# Altium footprint library Amplifier.PcbLib: 107 footprints (part 5 of 7) (continued)
## TLA06BBA [mm] "Micro SMD, 6-Leads, Body 1.54x1.03mm, Pitch 0.5mm, NSC Recommended"
height 0.68
pads (6):
  round 0.265 smd paste-0.132 mask+0.05: A1(-0.25,0.5) A2(0.25,0.5) B1(-0.25,0) B2(0.25,0) C1(-0.25,-0.5) C2(0.25,-0.5)
Top Overlay:
  circle w0.1: c-0.62,0.875 r0.05
Top Paste:
  circle w0.05: c-0.325,0.425 r0.025
  circle w0.05: c-0.175,0.575 r0.025
  circle w0.05: c-0.175,0.425 r0.025
  circle w0.05: c-0.325,0.575 r0.025
  circle w0.05: c0.175,0.425 r0.025
  circle w0.05: c0.325,0.575 r0.025
  circle w0.05: c0.325,0.425 r0.025
  circle w0.05: c0.175,0.575 r0.025
  circle w0.05: c-0.325,-0.075 r0.025
  circle w0.05: c-0.175,0.075 r0.025
  circle w0.05: c-0.175,-0.075 r0.025
  circle w0.05: c-0.325,0.075 r0.025
  circle w0.05: c0.175,-0.075 r0.025
  circle w0.05: c0.325,0.075 r0.025
  circle w0.05: c0.325,-0.075 r0.025
  circle w0.05: c0.175,0.075 r0.025
  circle w0.05: c-0.325,-0.575 r0.025
  circle w0.05: c-0.175,-0.425 r0.025
  circle w0.05: c-0.175,-0.575 r0.025
  circle w0.05: c-0.325,-0.425 r0.025
  circle w0.05: c0.175,-0.575 r0.025
  circle w0.05: c0.325,-0.425 r0.025
  circle w0.05: c0.325,-0.575 r0.025
  circle w0.05: c0.175,-0.425 r0.025
  region: -0.325,0.575 -0.325,0.425 -0.175,0.425 -0.175,0.575
  region: -0.325,0.425 -0.325,0.575 -0.375,0.575 -0.375,0.425
  rectangle: -0.325,0.575 -0.175,0.625
  region: -0.175,0.575 -0.175,0.425 -0.125,0.425 -0.125,0.575
  region: -0.175,0.425 -0.325,0.425 -0.325,0.375 -0.175,0.375
  region: 0.175,0.575 0.175,0.425 0.325,0.425 0.325,0.575
  region: 0.175,0.425 0.175,0.575 0.125,0.575 0.125,0.425
  rectangle: 0.175,0.575 0.325,0.625
  region: 0.325,0.575 0.325,0.425 0.375,0.425 0.375,0.575
  region: 0.325,0.425 0.175,0.425 0.175,0.375 0.325,0.375
  region: -0.325,0.075 -0.325,-0.075 -0.175,-0.075 -0.175,0.075
  region: -0.325,-0.075 -0.325,0.075 -0.375,0.075 -0.375,-0.075
  rectangle: -0.325,0.075 -0.175,0.125
  region: -0.175,0.075 -0.175,-0.075 -0.125,-0.075 -0.125,0.075
  region: -0.175,-0.075 -0.325,-0.075 -0.325,-0.125 -0.175,-0.125
  region: 0.175,0.075 0.175,-0.075 0.325,-0.075 0.325,0.075
  region: 0.175,-0.075 0.175,0.075 0.125,0.075 0.125,-0.075
  rectangle: 0.175,0.075 0.325,0.125
  region: 0.325,0.075 0.325,-0.075 0.375,-0.075 0.375,0.075
  region: 0.325,-0.075 0.175,-0.075 0.175,-0.125 0.325,-0.125
  region: -0.325,-0.425 -0.325,-0.575 -0.175,-0.575 -0.175,-0.425
  region: -0.325,-0.575 -0.325,-0.425 -0.375,-0.425 -0.375,-0.575
  rectangle: -0.325,-0.425 -0.175,-0.375
  region: -0.175,-0.425 -0.175,-0.575 -0.125,-0.575 -0.125,-0.425
  region: -0.175,-0.575 -0.325,-0.575 -0.325,-0.625 -0.175,-0.625
  region: 0.175,-0.425 0.175,-0.575 0.325,-0.575 0.325,-0.425
  region: 0.175,-0.575 0.175,-0.425 0.125,-0.425 0.125,-0.575
  rectangle: 0.175,-0.425 0.325,-0.375
  region: 0.325,-0.425 0.325,-0.575 0.375,-0.575 0.375,-0.425
  region: 0.325,-0.575 0.175,-0.575 0.175,-0.625 0.325,-0.625
Mechanical 13:
  lines w0.1: -0.515,-0.77 -0.515,0.77 0.515,0.77 0.515,-0.77 -0.515,-0.77
Mechanical 15:
  lines w0.05: -0.615,-0.87 -0.615,0.87 0.615,0.87 0.615,-0.87 -0.615,-0.87
  lines w0.1: -0.5,0 0.5,0 ; 0,-0.5 0,0.5
3D body: height 0.68, standoff 0, extent -0.515,-0.77 0.515,0.77

## TLA08AAA [mm] "Micro SMD, 8-Leads, Body 1.52x1.52mm, Pitch 0.5mm, NSC Recommended"
height 0.68
pads (8):
  round 0.265 smd paste-0.132 mask+0.05: A1(-0.5,0.5) A2(0,0.5) A3(0.5,0.5) B1(-0.5,0) B3(0.5,0) C1(-0.5,-0.5) C2(0,-0.5) C3(0.5,-0.5)
Top Overlay:
  circle w0.1: c-0.86,0.86 r0.05
Top Paste:
  circle w0.05: c0.425,-0.425 r0.025
  circle w0.05: c0.575,-0.575 r0.025
  circle w0.05: c0.575,-0.425 r0.025
  circle w0.05: c0.425,-0.575 r0.025
  circle w0.05: c-0.075,-0.425 r0.025
  circle w0.05: c0.075,-0.575 r0.025
  circle w0.05: c0.075,-0.425 r0.025
  circle w0.05: c-0.075,-0.575 r0.025
  circle w0.05: c-0.575,-0.425 r0.025
  circle w0.05: c-0.425,-0.575 r0.025
  circle w0.05: c-0.425,-0.425 r0.025
  circle w0.05: c-0.575,-0.575 r0.025
  circle w0.05: c0.425,0.075 r0.025
  circle w0.05: c0.575,-0.075 r0.025
  circle w0.05: c0.575,0.075 r0.025
  circle w0.05: c0.425,-0.075 r0.025
  circle w0.05: c-0.575,0.075 r0.025
  circle w0.05: c-0.425,-0.075 r0.025
  circle w0.05: c-0.425,0.075 r0.025
  circle w0.05: c-0.575,-0.075 r0.025
  circle w0.05: c0.425,0.575 r0.025
  circle w0.05: c0.575,0.425 r0.025
  circle w0.05: c0.575,0.575 r0.025
  circle w0.05: c0.425,0.425 r0.025
  circle w0.05: c-0.075,0.575 r0.025
  circle w0.05: c0.075,0.425 r0.025
  circle w0.05: c0.075,0.575 r0.025
  circle w0.05: c-0.075,0.425 r0.025
  circle w0.05: c-0.575,0.575 r0.025
  circle w0.05: c-0.425,0.425 r0.025
  circle w0.05: c-0.425,0.575 r0.025
  circle w0.05: c-0.575,0.425 r0.025
  region: 0.575,-0.575 0.425,-0.575 0.425,-0.625 0.575,-0.625
  region: 0.575,-0.425 0.575,-0.575 0.625,-0.575 0.625,-0.425
  rectangle: 0.425,-0.425 0.575,-0.375
  region: 0.425,-0.575 0.425,-0.425 0.375,-0.425 0.375,-0.575
  region: 0.425,-0.425 0.425,-0.575 0.575,-0.575 0.575,-0.425
  region: 0.075,-0.575 -0.075,-0.575 -0.075,-0.625 0.075,-0.625
  region: 0.075,-0.425 0.075,-0.575 0.125,-0.575 0.125,-0.425
  rectangle: -0.075,-0.425 0.075,-0.375
  region: -0.075,-0.575 -0.075,-0.425 -0.125,-0.425 -0.125,-0.575
  region: -0.075,-0.425 -0.075,-0.575 0.075,-0.575 0.075,-0.425
  region: -0.425,-0.575 -0.575,-0.575 -0.575,-0.625 -0.425,-0.625
  region: -0.425,-0.425 -0.425,-0.575 -0.375,-0.575 -0.375,-0.425
  rectangle: -0.575,-0.425 -0.425,-0.375
  region: -0.575,-0.575 -0.575,-0.425 -0.625,-0.425 -0.625,-0.575
  region: -0.575,-0.425 -0.575,-0.575 -0.425,-0.575 -0.425,-0.425
  region: 0.575,-0.075 0.425,-0.075 0.425,-0.125 0.575,-0.125
  region: 0.575,0.075 0.575,-0.075 0.625,-0.075 0.625,0.075
  rectangle: 0.425,0.075 0.575,0.125
  region: 0.425,-0.075 0.425,0.075 0.375,0.075 0.375,-0.075
  region: 0.425,0.075 0.425,-0.075 0.575,-0.075 0.575,0.075
  region: -0.425,-0.075 -0.575,-0.075 -0.575,-0.125 -0.425,-0.125
  region: -0.425,0.075 -0.425,-0.075 -0.375,-0.075 -0.375,0.075
  rectangle: -0.575,0.075 -0.425,0.125
  region: -0.575,-0.075 -0.575,0.075 -0.625,0.075 -0.625,-0.075
  region: -0.575,0.075 -0.575,-0.075 -0.425,-0.075 -0.425,0.075
  region: 0.575,0.425 0.425,0.425 0.425,0.375 0.575,0.375
  region: 0.575,0.575 0.575,0.425 0.625,0.425 0.625,0.575
  rectangle: 0.425,0.575 0.575,0.625
  region: 0.425,0.425 0.425,0.575 0.375,0.575 0.375,0.425
  region: 0.425,0.575 0.425,0.425 0.575,0.425 0.575,0.575
  region: 0.075,0.425 -0.075,0.425 -0.075,0.375 0.075,0.375
  region: 0.075,0.575 0.075,0.425 0.125,0.425 0.125,0.575
  rectangle: -0.075,0.575 0.075,0.625
  region: -0.075,0.425 -0.075,0.575 -0.125,0.575 -0.125,0.425
  region: -0.075,0.575 -0.075,0.425 0.075,0.425 0.075,0.575
  region: -0.425,0.425 -0.575,0.425 -0.575,0.375 -0.425,0.375
  region: -0.425,0.575 -0.425,0.425 -0.375,0.425 -0.375,0.575
  rectangle: -0.575,0.575 -0.425,0.625
  region: -0.575,0.425 -0.575,0.575 -0.625,0.575 -0.625,0.425
  region: -0.575,0.575 -0.575,0.425 -0.425,0.425 -0.425,0.575
Mechanical 13:
  lines w0.1: -0.755,-0.755 0.755,-0.755 0.755,0.755 -0.755,0.755 -0.755,-0.755
Mechanical 15:
  lines w0.05: -0.855,-0.855 0.855,-0.855 0.855,0.855 -0.855,0.855 -0.855,-0.855
  lines w0.1: -0.5,0 0.5,0 ; 0,-0.5 0,0.5
3D body: height 0.68, standoff 0, extent -0.755,-0.755 0.755,0.755

## TLA08JQA [mm] "Micro SMD, 8-Leads, Body 1.87x1.72mm, Pitch 0.5mm, NSC Recommended"
height 0.68
pads (8):
  round 0.265 smd paste-0.132 mask+0.05: A1(-0.5,0.5) A2(0,0.5) A3(0.5,0.5) B1(-0.5,0) B3(0.5,0) C1(-0.5,-0.5) C2(0,-0.5) C3(0.5,-0.5)
Top Overlay:
  circle w0.1: c-0.965,1.04 r0.05
Top Paste:
  circle w0.05: c0.425,-0.425 r0.025
  circle w0.05: c0.575,-0.575 r0.025
  circle w0.05: c0.575,-0.425 r0.025
  circle w0.05: c0.425,-0.575 r0.025
  circle w0.05: c-0.075,-0.425 r0.025
  circle w0.05: c0.075,-0.575 r0.025
  circle w0.05: c0.075,-0.425 r0.025
  circle w0.05: c-0.075,-0.575 r0.025
  circle w0.05: c-0.575,-0.425 r0.025
  circle w0.05: c-0.425,-0.575 r0.025
  circle w0.05: c-0.425,-0.425 r0.025
  circle w0.05: c-0.575,-0.575 r0.025
  circle w0.05: c0.425,0.075 r0.025
  circle w0.05: c0.575,-0.075 r0.025
  circle w0.05: c0.575,0.075 r0.025
  circle w0.05: c0.425,-0.075 r0.025
  circle w0.05: c-0.575,0.075 r0.025
  circle w0.05: c-0.425,-0.075 r0.025
  circle w0.05: c-0.425,0.075 r0.025
  circle w0.05: c-0.575,-0.075 r0.025
  circle w0.05: c0.425,0.575 r0.025
  circle w0.05: c0.575,0.425 r0.025
  circle w0.05: c0.575,0.575 r0.025
  circle w0.05: c0.425,0.425 r0.025
  circle w0.05: c-0.075,0.575 r0.025
  circle w0.05: c0.075,0.425 r0.025
  circle w0.05: c0.075,0.575 r0.025
  circle w0.05: c-0.075,0.425 r0.025
  circle w0.05: c-0.575,0.575 r0.025
  circle w0.05: c-0.425,0.425 r0.025
  circle w0.05: c-0.425,0.575 r0.025
  circle w0.05: c-0.575,0.425 r0.025
  region: 0.575,-0.575 0.425,-0.575 0.425,-0.625 0.575,-0.625
  region: 0.575,-0.425 0.575,-0.575 0.625,-0.575 0.625,-0.425
  rectangle: 0.425,-0.425 0.575,-0.375
  region: 0.425,-0.575 0.425,-0.425 0.375,-0.425 0.375,-0.575
  region: 0.425,-0.425 0.425,-0.575 0.575,-0.575 0.575,-0.425
  region: 0.075,-0.575 -0.075,-0.575 -0.075,-0.625 0.075,-0.625
  region: 0.075,-0.425 0.075,-0.575 0.125,-0.575 0.125,-0.425
  rectangle: -0.075,-0.425 0.075,-0.375
  region: -0.075,-0.575 -0.075,-0.425 -0.125,-0.425 -0.125,-0.575
  region: -0.075,-0.425 -0.075,-0.575 0.075,-0.575 0.075,-0.425
  region: -0.425,-0.575 -0.575,-0.575 -0.575,-0.625 -0.425,-0.625
  region: -0.425,-0.425 -0.425,-0.575 -0.375,-0.575 -0.375,-0.425
  rectangle: -0.575,-0.425 -0.425,-0.375
  region: -0.575,-0.575 -0.575,-0.425 -0.625,-0.425 -0.625,-0.575
  region: -0.575,-0.425 -0.575,-0.575 -0.425,-0.575 -0.425,-0.425
  region: 0.575,-0.075 0.425,-0.075 0.425,-0.125 0.575,-0.125
  region: 0.575,0.075 0.575,-0.075 0.625,-0.075 0.625,0.075
  rectangle: 0.425,0.075 0.575,0.125
  region: 0.425,-0.075 0.425,0.075 0.375,0.075 0.375,-0.075
  region: 0.425,0.075 0.425,-0.075 0.575,-0.075 0.575,0.075
  region: -0.425,-0.075 -0.575,-0.075 -0.575,-0.125 -0.425,-0.125
  region: -0.425,0.075 -0.425,-0.075 -0.375,-0.075 -0.375,0.075
  rectangle: -0.575,0.075 -0.425,0.125
  region: -0.575,-0.075 -0.575,0.075 -0.625,0.075 -0.625,-0.075
  region: -0.575,0.075 -0.575,-0.075 -0.425,-0.075 -0.425,0.075
  region: 0.575,0.425 0.425,0.425 0.425,0.375 0.575,0.375
  region: 0.575,0.575 0.575,0.425 0.625,0.425 0.625,0.575
  rectangle: 0.425,0.575 0.575,0.625
  region: 0.425,0.425 0.425,0.575 0.375,0.575 0.375,0.425
  region: 0.425,0.575 0.425,0.425 0.575,0.425 0.575,0.575
  region: 0.075,0.425 -0.075,0.425 -0.075,0.375 0.075,0.375
  region: 0.075,0.575 0.075,0.425 0.125,0.425 0.125,0.575
  rectangle: -0.075,0.575 0.075,0.625
  region: -0.075,0.425 -0.075,0.575 -0.125,0.575 -0.125,0.425
  region: -0.075,0.575 -0.075,0.425 0.075,0.425 0.075,0.575
  region: -0.425,0.425 -0.575,0.425 -0.575,0.375 -0.425,0.375
  region: -0.425,0.575 -0.425,0.425 -0.375,0.425 -0.375,0.575
  rectangle: -0.575,0.575 -0.425,0.625
  region: -0.575,0.425 -0.575,0.575 -0.625,0.575 -0.625,0.425
  region: -0.575,0.575 -0.575,0.425 -0.425,0.425 -0.425,0.575
Mechanical 13:
  lines w0.1: -0.86,-0.935 0.86,-0.935 0.86,0.935 -0.86,0.935 -0.86,-0.935
Mechanical 15:
  lines w0.05: -0.96,-1.035 0.96,-1.035 0.96,1.035 -0.96,1.035 -0.96,-1.035
  lines w0.1: -0.5,0 0.5,0 ; 0,-0.5 0,0.5
3D body: height 0.68, standoff 0, extent -0.86,-0.935 0.86,0.935

## TLP10BBA [mm] "Micro SMD, 10-Leads, Body 2.02x1.54mm, Pitch 0.5mm, NSC Recommended"
height 0.68
pads (10):
  round 0.265 smd paste-0.132 mask+0.05: A1(-0.5,0.75) A2(0,0.75) A3(0.5,0.75) B1(-0.5,0.25) B3(0.5,0.25) C1(-0.5,-0.25) C3(0.5,-0.25) D1(-0.5,-0.75) D2(0,-0.75) D3(0.5,-0.75)
Top Overlay:
  circle w0.1: c-0.875,1.115 r0.05
Top Paste:
  circle w0.05: c0.425,-0.675 r0.025
  circle w0.05: c0.575,-0.825 r0.025
  circle w0.05: c0.575,-0.675 r0.025
  circle w0.05: c0.425,-0.825 r0.025
  circle w0.05: c-0.075,-0.675 r0.025
  circle w0.05: c0.075,-0.825 r0.025
  circle w0.05: c0.075,-0.675 r0.025
  circle w0.05: c-0.075,-0.825 r0.025
  circle w0.05: c-0.575,-0.675 r0.025
  circle w0.05: c-0.425,-0.825 r0.025
  circle w0.05: c-0.425,-0.675 r0.025
  circle w0.05: c-0.575,-0.825 r0.025
  circle w0.05: c0.425,-0.175 r0.025
  circle w0.05: c0.575,-0.325 r0.025
  circle w0.05: c0.575,-0.175 r0.025
  circle w0.05: c0.425,-0.325 r0.025
  circle w0.05: c-0.575,-0.175 r0.025
  circle w0.05: c-0.425,-0.325 r0.025
  circle w0.05: c-0.425,-0.175 r0.025
  circle w0.05: c-0.575,-0.325 r0.025
  circle w0.05: c0.425,0.325 r0.025
  circle w0.05: c0.575,0.175 r0.025
  circle w0.05: c0.575,0.325 r0.025
  circle w0.05: c0.425,0.175 r0.025
  circle w0.05: c-0.575,0.325 r0.025
  circle w0.05: c-0.425,0.175 r0.025
  circle w0.05: c-0.425,0.325 r0.025
  circle w0.05: c-0.575,0.175 r0.025
  circle w0.05: c0.425,0.825 r0.025
  circle w0.05: c0.575,0.675 r0.025
  circle w0.05: c0.575,0.825 r0.025
  circle w0.05: c0.425,0.675 r0.025
  circle w0.05: c-0.075,0.825 r0.025
  circle w0.05: c0.075,0.675 r0.025
  circle w0.05: c0.075,0.825 r0.025
  circle w0.05: c-0.075,0.675 r0.025
  circle w0.05: c-0.575,0.825 r0.025
  circle w0.05: c-0.425,0.675 r0.025
  circle w0.05: c-0.425,0.825 r0.025
  circle w0.05: c-0.575,0.675 r0.025
  region: 0.575,-0.825 0.425,-0.825 0.425,-0.875 0.575,-0.875
  region: 0.575,-0.675 0.575,-0.825 0.625,-0.825 0.625,-0.675
  rectangle: 0.425,-0.675 0.575,-0.625
  region: 0.425,-0.825 0.425,-0.675 0.375,-0.675 0.375,-0.825
  region: 0.425,-0.675 0.425,-0.825 0.575,-0.825 0.575,-0.675
  region: 0.075,-0.825 -0.075,-0.825 -0.075,-0.875 0.075,-0.875
  region: 0.075,-0.675 0.075,-0.825 0.125,-0.825 0.125,-0.675
  rectangle: -0.075,-0.675 0.075,-0.625
  region: -0.075,-0.825 -0.075,-0.675 -0.125,-0.675 -0.125,-0.825
  region: -0.075,-0.675 -0.075,-0.825 0.075,-0.825 0.075,-0.675
  region: -0.425,-0.825 -0.575,-0.825 -0.575,-0.875 -0.425,-0.875
  region: -0.425,-0.675 -0.425,-0.825 -0.375,-0.825 -0.375,-0.675
  rectangle: -0.575,-0.675 -0.425,-0.625
  region: -0.575,-0.825 -0.575,-0.675 -0.625,-0.675 -0.625,-0.825
  region: -0.575,-0.675 -0.575,-0.825 -0.425,-0.825 -0.425,-0.675
  region: 0.575,-0.325 0.425,-0.325 0.425,-0.375 0.575,-0.375
  region: 0.575,-0.175 0.575,-0.325 0.625,-0.325 0.625,-0.175
  rectangle: 0.425,-0.175 0.575,-0.125
  region: 0.425,-0.325 0.425,-0.175 0.375,-0.175 0.375,-0.325
  region: 0.425,-0.175 0.425,-0.325 0.575,-0.325 0.575,-0.175
  region: -0.425,-0.325 -0.575,-0.325 -0.575,-0.375 -0.425,-0.375
  region: -0.425,-0.175 -0.425,-0.325 -0.375,-0.325 -0.375,-0.175
  rectangle: -0.575,-0.175 -0.425,-0.125
  region: -0.575,-0.325 -0.575,-0.175 -0.625,-0.175 -0.625,-0.325
  region: -0.575,-0.175 -0.575,-0.325 -0.425,-0.325 -0.425,-0.175
  region: 0.575,0.175 0.425,0.175 0.425,0.125 0.575,0.125
  region: 0.575,0.325 0.575,0.175 0.625,0.175 0.625,0.325
  rectangle: 0.425,0.325 0.575,0.375
  region: 0.425,0.175 0.425,0.325 0.375,0.325 0.375,0.175
  region: 0.425,0.325 0.425,0.175 0.575,0.175 0.575,0.325
  region: -0.425,0.175 -0.575,0.175 -0.575,0.125 -0.425,0.125
  region: -0.425,0.325 -0.425,0.175 -0.375,0.175 -0.375,0.325
  rectangle: -0.575,0.325 -0.425,0.375
  region: -0.575,0.175 -0.575,0.325 -0.625,0.325 -0.625,0.175
  region: -0.575,0.325 -0.575,0.175 -0.425,0.175 -0.425,0.325
  region: 0.575,0.675 0.425,0.675 0.425,0.625 0.575,0.625
  region: 0.575,0.825 0.575,0.675 0.625,0.675 0.625,0.825
  rectangle: 0.425,0.825 0.575,0.875
  region: 0.425,0.675 0.425,0.825 0.375,0.825 0.375,0.675
  region: 0.425,0.825 0.425,0.675 0.575,0.675 0.575,0.825
  region: 0.075,0.675 -0.075,0.675 -0.075,0.625 0.075,0.625
  region: 0.075,0.825 0.075,0.675 0.125,0.675 0.125,0.825
  rectangle: -0.075,0.825 0.075,0.875
  region: -0.075,0.675 -0.075,0.825 -0.125,0.825 -0.125,0.675
  region: -0.075,0.825 -0.075,0.675 0.075,0.675 0.075,0.825
  region: -0.425,0.675 -0.575,0.675 -0.575,0.625 -0.425,0.625
  region: -0.425,0.825 -0.425,0.675 -0.375,0.675 -0.375,0.825
  rectangle: -0.575,0.825 -0.425,0.875
  region: -0.575,0.675 -0.575,0.825 -0.625,0.825 -0.625,0.675
  region: -0.575,0.825 -0.575,0.675 -0.425,0.675 -0.425,0.825
Mechanical 13:
  lines w0.1: -0.77,-1.01 0.77,-1.01 0.77,1.01 -0.77,1.01 -0.77,-1.01
Mechanical 15:
  lines w0.05: -0.87,-1.11 0.87,-1.11 0.87,1.11 -0.87,1.11 -0.87,-1.11
  lines w0.1: -0.5,0 0.5,0 ; 0,-0.5 0,0.5
3D body: height 0.68, standoff 0, extent -0.77,-1.01 0.77,1.01

## TMD08CCA [mm] "Micro SMD, 8-Leads, Body 1.22x1.22mm, Pitch 0.4mm, NSC Recommended"
height 0.68
pads (8):
  round 0.225 smd paste-0.112 mask+0.05: A1(-0.4,0.4) A2(0,0.4) A3(0.4,0.4) B1(-0.4,0) B3(0.4,0) C1(-0.4,-0.4) C2(0,-0.4) C3(0.4,-0.4)
Top Overlay:
  circle w0.1: c-0.715,0.715 r0.05
Top Paste:
  circle w0.05: c-0.325,0.475 r0.025
  circle w0.05: c-0.475,0.325 r0.025
  circle w0.05: c-0.475,0.475 r0.025
  circle w0.05: c-0.325,0.325 r0.025
  circle w0.05: c0.075,0.475 r0.025
  circle w0.05: c-0.075,0.325 r0.025
  circle w0.05: c-0.075,0.475 r0.025
  circle w0.05: c0.075,0.325 r0.025
  circle w0.05: c0.475,0.475 r0.025
  circle w0.05: c0.325,0.325 r0.025
  circle w0.05: c0.325,0.475 r0.025
  circle w0.05: c0.475,0.325 r0.025
  circle w0.05: c-0.325,0.075 r0.025
  circle w0.05: c-0.475,-0.075 r0.025
  circle w0.05: c-0.475,0.075 r0.025
  circle w0.05: c-0.325,-0.075 r0.025
  circle w0.05: c0.475,0.075 r0.025
  circle w0.05: c0.325,-0.075 r0.025
  circle w0.05: c0.325,0.075 r0.025
  circle w0.05: c0.475,-0.075 r0.025
  circle w0.05: c-0.325,-0.325 r0.025
  circle w0.05: c-0.475,-0.475 r0.025
  circle w0.05: c-0.475,-0.325 r0.025
  circle w0.05: c-0.325,-0.475 r0.025
  circle w0.05: c0.075,-0.325 r0.025
  circle w0.05: c-0.075,-0.475 r0.025
  circle w0.05: c-0.075,-0.325 r0.025
  circle w0.05: c0.075,-0.475 r0.025
  circle w0.05: c0.475,-0.325 r0.025
  circle w0.05: c0.325,-0.475 r0.025
  circle w0.05: c0.325,-0.325 r0.025
  circle w0.05: c0.475,-0.475 r0.025
  rectangle: -0.475,0.275 -0.325,0.325
  region: -0.525,0.475 -0.525,0.325 -0.475,0.325 -0.475,0.475
  region: -0.325,0.525 -0.475,0.525 -0.475,0.475 -0.325,0.475
  region: -0.275,0.325 -0.275,0.475 -0.325,0.475 -0.325,0.325
  region: -0.475,0.475 -0.475,0.325 -0.325,0.325 -0.325,0.475
  rectangle: -0.075,0.275 0.075,0.325
  region: -0.125,0.475 -0.125,0.325 -0.075,0.325 -0.075,0.475
  region: 0.075,0.525 -0.075,0.525 -0.075,0.475 0.075,0.475
  region: 0.125,0.325 0.125,0.475 0.075,0.475 0.075,0.325
  region: -0.075,0.475 -0.075,0.325 0.075,0.325 0.075,0.475
  rectangle: 0.325,0.275 0.475,0.325
  region: 0.275,0.475 0.275,0.325 0.325,0.325 0.325,0.475
  region: 0.475,0.525 0.325,0.525 0.325,0.475 0.475,0.475
  region: 0.525,0.325 0.525,0.475 0.475,0.475 0.475,0.325
  region: 0.325,0.475 0.325,0.325 0.475,0.325 0.475,0.475
  rectangle: -0.475,-0.125 -0.325,-0.075
  region: -0.525,0.075 -0.525,-0.075 -0.475,-0.075 -0.475,0.075
  region: -0.325,0.125 -0.475,0.125 -0.475,0.075 -0.325,0.075
  region: -0.275,-0.075 -0.275,0.075 -0.325,0.075 -0.325,-0.075
  region: -0.475,0.075 -0.475,-0.075 -0.325,-0.075 -0.325,0.075
  rectangle: 0.325,-0.125 0.475,-0.075
  region: 0.275,0.075 0.275,-0.075 0.325,-0.075 0.325,0.075
  region: 0.475,0.125 0.325,0.125 0.325,0.075 0.475,0.075
  region: 0.525,-0.075 0.525,0.075 0.475,0.075 0.475,-0.075
  region: 0.325,0.075 0.325,-0.075 0.475,-0.075 0.475,0.075
  rectangle: -0.475,-0.525 -0.325,-0.475
  region: -0.525,-0.325 -0.525,-0.475 -0.475,-0.475 -0.475,-0.325
  region: -0.325,-0.275 -0.475,-0.275 -0.475,-0.325 -0.325,-0.325
  region: -0.275,-0.475 -0.275,-0.325 -0.325,-0.325 -0.325,-0.475
  region: -0.475,-0.325 -0.475,-0.475 -0.325,-0.475 -0.325,-0.325
  rectangle: -0.075,-0.525 0.075,-0.475
  region: -0.125,-0.325 -0.125,-0.475 -0.075,-0.475 -0.075,-0.325
  region: 0.075,-0.275 -0.075,-0.275 -0.075,-0.325 0.075,-0.325
  region: 0.125,-0.475 0.125,-0.325 0.075,-0.325 0.075,-0.475
  region: -0.075,-0.325 -0.075,-0.475 0.075,-0.475 0.075,-0.325
  rectangle: 0.325,-0.525 0.475,-0.475
  region: 0.275,-0.325 0.275,-0.475 0.325,-0.475 0.325,-0.325
  region: 0.475,-0.275 0.325,-0.275 0.325,-0.325 0.475,-0.325
  region: 0.525,-0.475 0.525,-0.325 0.475,-0.325 0.475,-0.475
  region: 0.325,-0.325 0.325,-0.475 0.475,-0.475 0.475,-0.325
Mechanical 13:
  lines w0.1: -0.61,-0.61 -0.61,0.61 0.61,0.61 0.61,-0.61 -0.61,-0.61
Mechanical 15:
  lines w0.05: -0.71,-0.71 -0.71,0.71 0.71,0.71 0.71,-0.71 -0.71,-0.71
  lines w0.1: -0.5,0 0.5,0 ; 0,-0.5 0,0.5
3D body: height 0.68, standoff 0, extent -0.61,-0.61 0.61,0.61

## TPA08AAA [mm] "Micro SMD, 8-Leads, Body 1.29x1.29mm, Pitch 0.5mm, NSC Recommended"
height 0.58
pads (8):
  round 0.165 smd paste-0.082 mask+0.05: A1(-0.5,0.5) A2(0,0.5) A3(0.5,0.5) B1(-0.5,0) B3(0.5,0) C1(-0.5,-0.5) C2(0,-0.5) C3(0.5,-0.5)
Top Overlay:
  circle w0.1: c-0.75,0.75 r0.05
Top Paste:
  circle w0.05: c0.4,-0.6 r0.025
  circle w0.05: c0.6,-0.4 r0.025
  circle w0.05: c0.4,-0.4 r0.025
  circle w0.05: c0.6,-0.6 r0.025
  circle w0.05: c-0.1,-0.6 r0.025
  circle w0.05: c0.1,-0.4 r0.025
  circle w0.05: c-0.1,-0.4 r0.025
  circle w0.05: c0.1,-0.6 r0.025
  circle w0.05: c-0.6,-0.6 r0.025
  circle w0.05: c-0.4,-0.4 r0.025
  circle w0.05: c-0.6,-0.4 r0.025
  circle w0.05: c-0.4,-0.6 r0.025
  circle w0.05: c0.4,-0.1 r0.025
  circle w0.05: c0.6,0.1 r0.025
  circle w0.05: c0.4,0.1 r0.025
  circle w0.05: c0.6,-0.1 r0.025
  circle w0.05: c-0.6,-0.1 r0.025
  circle w0.05: c-0.4,0.1 r0.025
  circle w0.05: c-0.6,0.1 r0.025
  circle w0.05: c-0.4,-0.1 r0.025
  circle w0.05: c0.4,0.4 r0.025
  circle w0.05: c0.6,0.6 r0.025
  circle w0.05: c0.4,0.6 r0.025
  circle w0.05: c0.6,0.4 r0.025
  circle w0.05: c-0.1,0.4 r0.025
  circle w0.05: c0.1,0.6 r0.025
  circle w0.05: c-0.1,0.6 r0.025
  circle w0.05: c0.1,0.4 r0.025
  circle w0.05: c-0.6,0.4 r0.025
  circle w0.05: c-0.4,0.6 r0.025
  circle w0.05: c-0.6,0.6 r0.025
  circle w0.05: c-0.4,0.4 r0.025
  region: 0.6,-0.6 0.4,-0.6 0.4,-0.65 0.6,-0.65
  rectangle: 0.4,-0.6 0.6,-0.4
  rectangle: 0.4,-0.4 0.6,-0.35
  region: 0.4,-0.6 0.4,-0.4 0.35,-0.4 0.35,-0.6
  region: 0.6,-0.4 0.6,-0.6 0.65,-0.6 0.65,-0.4
  region: 0.1,-0.6 -0.1,-0.6 -0.1,-0.65 0.1,-0.65
  rectangle: -0.1,-0.6 0.1,-0.4
  rectangle: -0.1,-0.4 0.1,-0.35
  region: -0.1,-0.6 -0.1,-0.4 -0.15,-0.4 -0.15,-0.6
  region: 0.1,-0.4 0.1,-0.6 0.15,-0.6 0.15,-0.4
  region: -0.4,-0.6 -0.6,-0.6 -0.6,-0.65 -0.4,-0.65
  rectangle: -0.6,-0.6 -0.4,-0.4
  rectangle: -0.6,-0.4 -0.4,-0.35
  region: -0.6,-0.6 -0.6,-0.4 -0.65,-0.4 -0.65,-0.6
  region: -0.4,-0.4 -0.4,-0.6 -0.35,-0.6 -0.35,-0.4
  region: 0.6,-0.1 0.4,-0.1 0.4,-0.15 0.6,-0.15
  rectangle: 0.4,-0.1 0.6,0.1
  rectangle: 0.4,0.1 0.6,0.15
  region: 0.4,-0.1 0.4,0.1 0.35,0.1 0.35,-0.1
  region: 0.6,0.1 0.6,-0.1 0.65,-0.1 0.65,0.1
  region: -0.4,-0.1 -0.6,-0.1 -0.6,-0.15 -0.4,-0.15
  rectangle: -0.6,-0.1 -0.4,0.1
  rectangle: -0.6,0.1 -0.4,0.15
  region: -0.6,-0.1 -0.6,0.1 -0.65,0.1 -0.65,-0.1
  region: -0.4,0.1 -0.4,-0.1 -0.35,-0.1 -0.35,0.1
  region: 0.6,0.4 0.4,0.4 0.4,0.35 0.6,0.35
  rectangle: 0.4,0.4 0.6,0.6
  rectangle: 0.4,0.6 0.6,0.65
  region: 0.4,0.4 0.4,0.6 0.35,0.6 0.35,0.4
  region: 0.6,0.6 0.6,0.4 0.65,0.4 0.65,0.6
  region: 0.1,0.4 -0.1,0.4 -0.1,0.35 0.1,0.35
  rectangle: -0.1,0.4 0.1,0.6
  rectangle: -0.1,0.6 0.1,0.65
  region: -0.1,0.4 -0.1,0.6 -0.15,0.6 -0.15,0.4
  region: 0.1,0.6 0.1,0.4 0.15,0.4 0.15,0.6
  region: -0.4,0.4 -0.6,0.4 -0.6,0.35 -0.4,0.35
  rectangle: -0.6,0.4 -0.4,0.6
  rectangle: -0.6,0.6 -0.4,0.65
  region: -0.6,0.4 -0.6,0.6 -0.65,0.6 -0.65,0.4
  region: -0.4,0.6 -0.4,0.4 -0.35,0.4 -0.35,0.6
Mechanical 13:
  lines w0.1: -0.645,-0.645 0.645,-0.645 0.645,0.645 -0.645,0.645 -0.645,-0.645
Mechanical 15:
  lines w0.05: -0.745,-0.745 0.745,-0.745 0.745,0.745 -0.745,0.745 -0.745,-0.745
  lines w0.1: -0.5,0 0.5,0 ; 0,-0.5 0,0.5
3D body: height 0.58, standoff 0, extent -0.645,-0.645 0.645,0.645

## TPA08FFA [mm] "Micro SMD, 8-Leads, Body 1.41x1.41mm, Pitch 0.5mm, NSC Recommended"
height 0.58
pads (8):
  round 0.165 smd paste-0.082 mask+0.05: A1(-0.5,0.5) A2(0,0.5) A3(0.5,0.5) B1(-0.5,0) B3(0.5,0) C1(-0.5,-0.5) C2(0,-0.5) C3(0.5,-0.5)
Top Overlay:
  circle w0.1: c-0.81,0.81 r0.05
Top Paste:
  circle w0.05: c0.4,-0.6 r0.025
  circle w0.05: c0.6,-0.4 r0.025
  circle w0.05: c0.4,-0.4 r0.025
  circle w0.05: c0.6,-0.6 r0.025
  circle w0.05: c-0.1,-0.6 r0.025
  circle w0.05: c0.1,-0.4 r0.025
  circle w0.05: c-0.1,-0.4 r0.025
  circle w0.05: c0.1,-0.6 r0.025
  circle w0.05: c-0.6,-0.6 r0.025
  circle w0.05: c-0.4,-0.4 r0.025
  circle w0.05: c-0.6,-0.4 r0.025
  circle w0.05: c-0.4,-0.6 r0.025
  circle w0.05: c0.4,-0.1 r0.025
  circle w0.05: c0.6,0.1 r0.025
  circle w0.05: c0.4,0.1 r0.025
  circle w0.05: c0.6,-0.1 r0.025
  circle w0.05: c-0.6,-0.1 r0.025
  circle w0.05: c-0.4,0.1 r0.025
  circle w0.05: c-0.6,0.1 r0.025
  circle w0.05: c-0.4,-0.1 r0.025
  circle w0.05: c0.4,0.4 r0.025
  circle w0.05: c0.6,0.6 r0.025
  circle w0.05: c0.4,0.6 r0.025
  circle w0.05: c0.6,0.4 r0.025
  circle w0.05: c-0.1,0.4 r0.025
  circle w0.05: c0.1,0.6 r0.025
  circle w0.05: c-0.1,0.6 r0.025
  circle w0.05: c0.1,0.4 r0.025
  circle w0.05: c-0.6,0.4 r0.025
  circle w0.05: c-0.4,0.6 r0.025
  circle w0.05: c-0.6,0.6 r0.025
  circle w0.05: c-0.4,0.4 r0.025
  region: 0.6,-0.6 0.4,-0.6 0.4,-0.65 0.6,-0.65
  rectangle: 0.4,-0.6 0.6,-0.4
  rectangle: 0.4,-0.4 0.6,-0.35
  region: 0.4,-0.6 0.4,-0.4 0.35,-0.4 0.35,-0.6
  region: 0.6,-0.4 0.6,-0.6 0.65,-0.6 0.65,-0.4
  region: 0.1,-0.6 -0.1,-0.6 -0.1,-0.65 0.1,-0.65
  rectangle: -0.1,-0.6 0.1,-0.4
  rectangle: -0.1,-0.4 0.1,-0.35
  region: -0.1,-0.6 -0.1,-0.4 -0.15,-0.4 -0.15,-0.6
  region: 0.1,-0.4 0.1,-0.6 0.15,-0.6 0.15,-0.4
  region: -0.4,-0.6 -0.6,-0.6 -0.6,-0.65 -0.4,-0.65
  rectangle: -0.6,-0.6 -0.4,-0.4
  rectangle: -0.6,-0.4 -0.4,-0.35
  region: -0.6,-0.6 -0.6,-0.4 -0.65,-0.4 -0.65,-0.6
  region: -0.4,-0.4 -0.4,-0.6 -0.35,-0.6 -0.35,-0.4
  region: 0.6,-0.1 0.4,-0.1 0.4,-0.15 0.6,-0.15
  rectangle: 0.4,-0.1 0.6,0.1
  rectangle: 0.4,0.1 0.6,0.15
  region: 0.4,-0.1 0.4,0.1 0.35,0.1 0.35,-0.1
  region: 0.6,0.1 0.6,-0.1 0.65,-0.1 0.65,0.1
  region: -0.4,-0.1 -0.6,-0.1 -0.6,-0.15 -0.4,-0.15
  rectangle: -0.6,-0.1 -0.4,0.1
  rectangle: -0.6,0.1 -0.4,0.15
  region: -0.6,-0.1 -0.6,0.1 -0.65,0.1 -0.65,-0.1
  region: -0.4,0.1 -0.4,-0.1 -0.35,-0.1 -0.35,0.1
  region: 0.6,0.4 0.4,0.4 0.4,0.35 0.6,0.35
  rectangle: 0.4,0.4 0.6,0.6
  rectangle: 0.4,0.6 0.6,0.65
  region: 0.4,0.4 0.4,0.6 0.35,0.6 0.35,0.4
  region: 0.6,0.6 0.6,0.4 0.65,0.4 0.65,0.6
  region: 0.1,0.4 -0.1,0.4 -0.1,0.35 0.1,0.35
  rectangle: -0.1,0.4 0.1,0.6
  rectangle: -0.1,0.6 0.1,0.65
  region: -0.1,0.4 -0.1,0.6 -0.15,0.6 -0.15,0.4
  region: 0.1,0.6 0.1,0.4 0.15,0.4 0.15,0.6
  region: -0.4,0.4 -0.6,0.4 -0.6,0.35 -0.4,0.35
  rectangle: -0.6,0.4 -0.4,0.6
  rectangle: -0.6,0.6 -0.4,0.65
  region: -0.6,0.4 -0.6,0.6 -0.65,0.6 -0.65,0.4
  region: -0.4,0.6 -0.4,0.4 -0.35,0.4 -0.35,0.6
Mechanical 13:
  lines w0.1: -0.705,-0.705 0.705,-0.705 0.705,0.705 -0.705,0.705 -0.705,-0.705
Mechanical 15:
  lines w0.05: -0.805,-0.805 0.805,-0.805 0.805,0.805 -0.805,0.805 -0.805,-0.805
  lines w0.1: -0.5,0 0.5,0 ; 0,-0.5 0,0.5
3D body: height 0.58, standoff 0, extent -0.705,-0.705 0.705,0.705